# Altium footprint library Power_PcbLib.PcbLib: 23 footprints (part 1 of 2)
Each footprint in its own frame and in the unit in brackets; x right, y up, seen from the top. Pads: shape width x height; smd on the part's side, far side on the other; paste and mask are expansions set on the pad; w line width, h text height; cw(c..) or ccw(c..) is an arc to the next point about the centre after c.
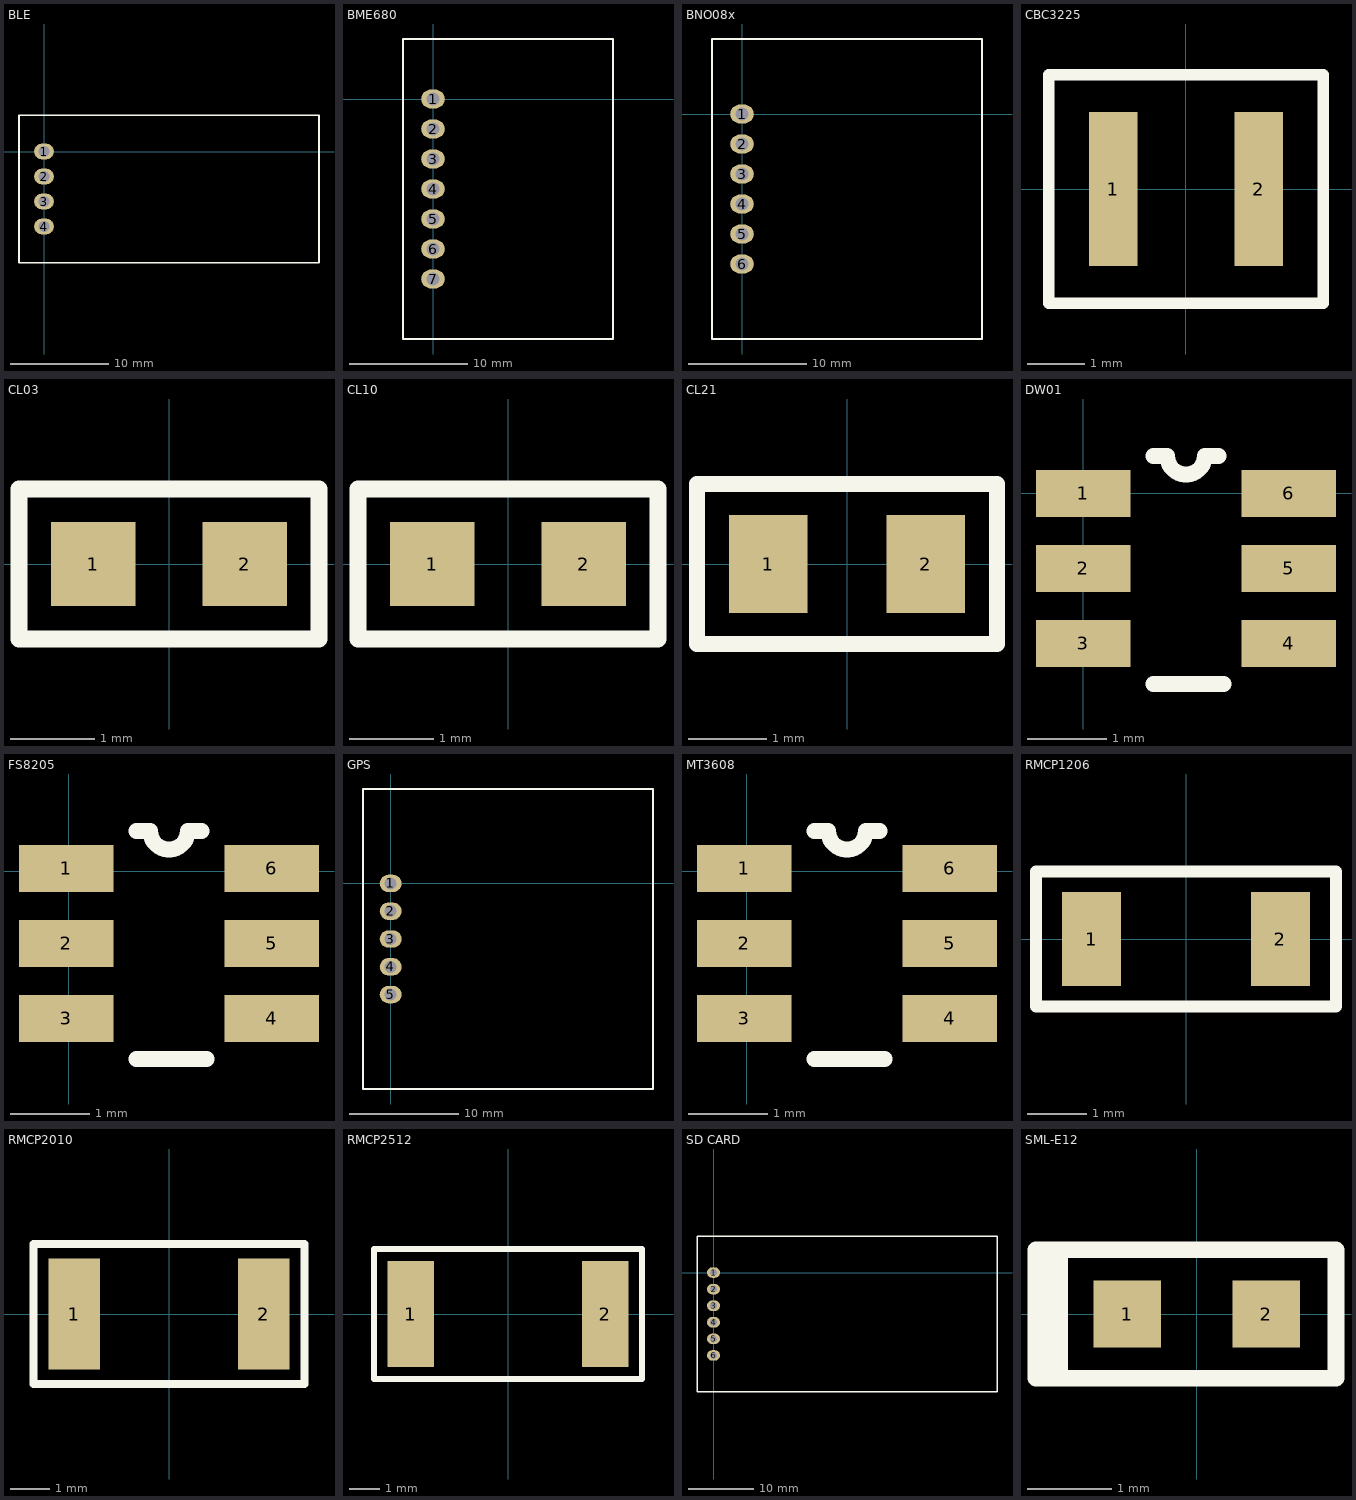
[diagram p0: the footprints below, top view; thin cyan lines are the x and y axes]

## BLE [mm]
pads (4):
  oval 2x1.6 hole 1.1: 1(0,0) 2(0,-2.54) 3(0,-5.08) 4(0,-7.62)
Top Overlay:
  lines w0.2: -2.54,-11.303 27.94,-11.303 27.94,3.683 -2.54,3.683 -2.54,-11.303

## BME680 [mm]
pads (7):
  oval 2x1.6 hole 1.1: 1(0,0) 2(0,-2.54) 3(0,-5.08) 4(0,-7.62) 5(0,-10.16) 6(0,-12.7) 7(0,-15.24)
Top Overlay:
  lines w0.2: -2.54,-20.32 -2.54,5.08 15.24,5.08 15.24,-20.32 -2.54,-20.32

## BNO08x [mm]
pads (6):
  oval 2x1.6 hole 1.1: 1(0,0) 2(0,-2.54) 3(0,-5.08) 4(0,-7.62) 5(0,-10.16) 6(0,-12.7)
Top Overlay:
  lines w0.2: -2.54,-19.05 20.32,-19.05 20.32,6.35 -2.54,6.35 -2.54,-19.05

## CBC3225 [mm]
pads (2):
  rect 0.85x2.7 smd: 1(-1.275,0) 2(1.275,0)
Top Overlay:
  lines w0.2: -2.4,-2 2.4,-2 2.4,2 -2.4,2 -2.4,-2

## CL03 [mm]
pads (2):
  rect 1x1 smd: 1(-0.9,0) 2(0.9,0)
Top Overlay:
  lines w0.2: -1.778,-0.889 1.778,-0.889 1.778,0.889 -1.778,0.889 -1.778,-0.889

## CL10 [mm]
pads (2):
  rect 1x1 smd: 1(-0.9,0) 2(0.9,0)
Top Overlay:
  lines w0.2: -1.778,-0.889 1.778,-0.889 1.778,0.889 -1.778,0.889 -1.778,-0.889

## CL21 [mm]
pads (2):
  rect 1x1.25 smd: 1(-1,0) 2(1,0)
Top Overlay:
  lines w0.2: -1.905,-1.016 1.905,-1.016 1.905,1.016 -1.905,1.016 -1.905,-1.016

## DW01 [mm]
pads (6):
  rect 1.2x0.6 smd: 1(0,0) 2(0,-0.95) 3(0,-1.9) 4(2.6,-1.9) 5(2.6,-0.95) 6(2.6,0)
Top Overlay:
  lines w0.2: 0.889,-2.413 1.778,-2.413 ; 0.889,0.475 1.062,0.475 ccw(c1.3,0.475) 1.538,0.475 1.711,0.475

## FS8205 [mm]
pads (6):
  rect 1.2x0.6 smd: 1(-0.03,0.033) 2(-0.03,-0.917) 3(-0.03,-1.867) 4(2.57,-1.867) 5(2.57,-0.917) 6(2.57,0.033)
Top Overlay:
  lines w0.2: 0.859,-2.38 1.748,-2.38 ; 0.859,0.508 1.032,0.508 ccw(c1.27,0.508) 1.508,0.508 1.681,0.508

## GPS [mm]
pads (5):
  oval 2x1.6 hole 1.1: 1(0,0) 2(0,-2.54) 3(0,-5.08) 4(0,-7.62) 5(0,-10.16)
Top Overlay:
  lines w0.2: -2.54,-18.796 -2.54,8.636 24.003,8.636 24.003,-18.796 -2.54,-18.796

## MT3608 [mm]
pads (6):
  rect 1.2x0.6 smd: 1(-0.03,0.033) 2(-0.03,-0.917) 3(-0.03,-1.867) 4(2.57,-1.867) 5(2.57,-0.917) 6(2.57,0.033)
Top Overlay:
  lines w0.2: 0.859,-2.38 1.748,-2.38 ; 0.859,0.508 1.032,0.508 ccw(c1.27,0.508) 1.508,0.508 1.681,0.508

## RMCP1206 [mm]
pads (2):
  rect 1x1.6 smd: 1(-1.6,0) 2(1.6,0)
Top Overlay:
  lines w0.2: -2.54,-1.143 2.54,-1.143 2.54,1.143 -2.54,1.143 -2.54,-1.143

## RMCP2010 [mm]
pads (2):
  rect 1.3x2.8 smd: 1(-2.4,0) 2(2.4,0)
Top Overlay:
  lines w0.2: -3.429,-1.778 -3.429,1.778 3.429,1.778 3.429,-1.778 -3.429,-1.778

## RMCP2512 [mm]
pads (2):
  rect 1.55x3.5 smd: 1(-3.225,0) 2(3.225,0)
Top Overlay:
  lines w0.2: -4.445,-2.159 4.445,-2.159 4.445,2.159 -4.445,2.159 -4.445,-2.159

## SD CARD [mm]
pads (6):
  oval 2x1.6 hole 1.1: 1(0,0) 2(0,-2.54) 3(0,-5.08) 4(0,-7.62) 5(0,-10.16) 6(0,-12.7)
Top Overlay:
  lines w0.2: -2.54,-18.288 -2.54,5.588 43.434,5.588 43.434,-18.288 -2.54,-18.288

## SML-E12 [mm]
pads (2):
  rect 0.8x0.8 smd: 1(-0.825,0) 2(0.825,0)
Top Overlay:
  rectangle: -1.905,-0.762 -1.524,0.762
  lines w0.2: -1.905,-0.762 -1.905,0.762 1.651,0.762 1.651,-0.762 -1.905,-0.762